# Altium footprint library Wurth_Elektronik_Electromechanic_Wire_to_Board_Connectors_rev16a.PCBLIB: 662 footprints (part 18 of 42)
Each footprint in its own frame and in the unit in brackets; x right, y up, seen from the top. Pads: shape width x height; smd on the part's side, far side on the other; paste and mask are expansions set on the pad; w line width, h text height; cw(c..) or ccw(c..) is an arc to the next point about the centre after c.
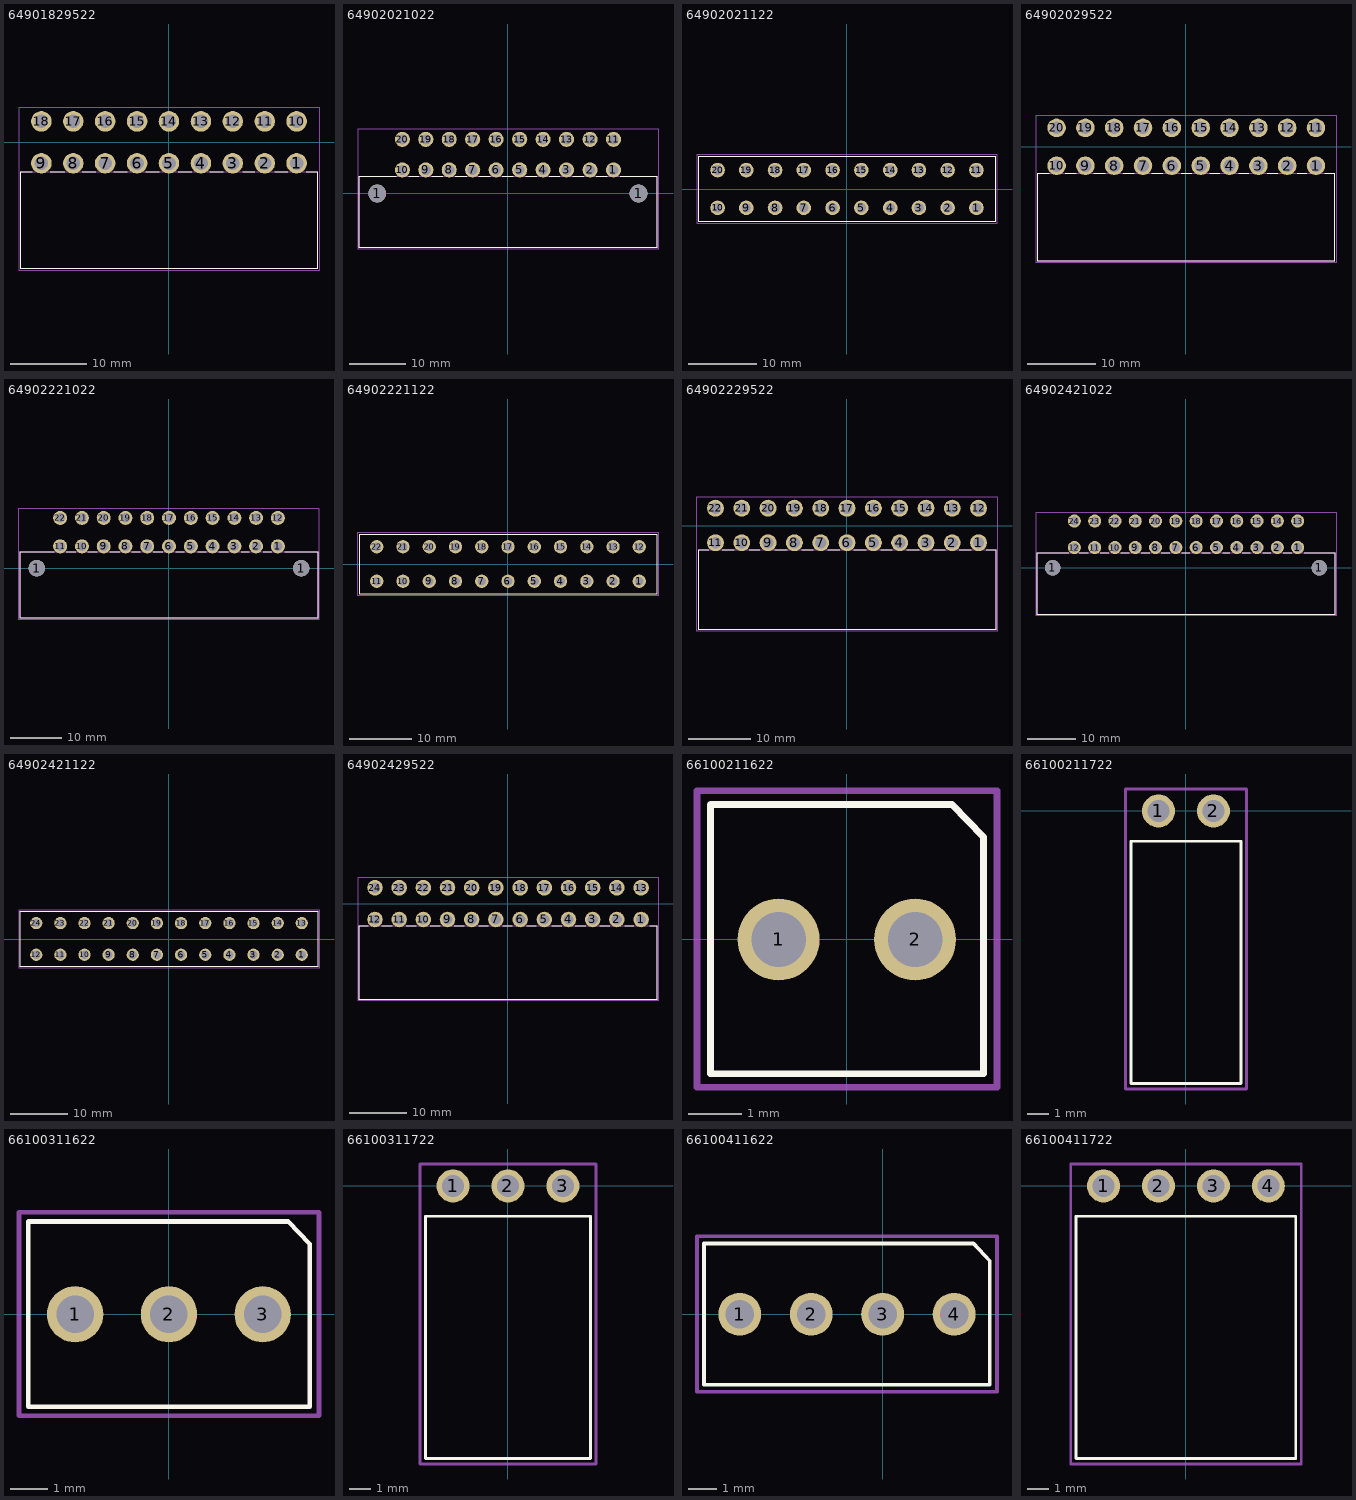
[diagram p17: the footprints below, top view; thin cyan lines are the x and y axes]

## 64901829522 [mil]
pads (18):
  round 106.5 hole 71: 1(662,-108.27) 2(497,-108.27) 3(331,-108.27) 4(166,-108.27) 5(0,-108.27) 6(-165.35,-108.27) 7(-330.71,-108.27) 8(-496.06,-108.27) 9(-661.42,-108.27) 10(662,109) 11(497,109) 12(331,109) 13(166,109) 14(0,109) 15(-165.35,109) 16(-330.71,109) 17(-496.06,109) 18(-661.42,109)
Top Overlay:
  lines w5: -708.66,-151.57 -767.72,-151.57 -767.72,-655.51 768,-655.51 768,-155.51 768,-151.57 711,-151.57 ; -616.14,-151.57 -541.34,-151.57 ; -450.79,-151.57 -379.92,-151.57 ; -287.4,-151.57 -216.54,-151.57 ; -120.08,-151.57 -49.21,-151.57 ; 48,-151.57 117,-151.57 ; 211,-151.57 282,-151.57 ; 382,-151.57 445,-151.57 ; 548,-151.57 617,-151.57
Mechanical 2:
  text ">NAME" at -1090.65,-383.86 h77.5
Mechanical 4:
  text ">VALUE" at -1090.65,-488.29 h77.5
Mechanical 16:
  lines w5: -767.72,-655.51 768,-655.51 768,-151.57 -767.72,-151.57 -767.72,-655.51
  text "18" at -721.85,75 h77.5
  text "1" at 653,-133.86 h77.5
Mechanical 27:
  lines w5: -777.56,-665.35 778,-665.35 778,182 -777.56,182 -777.56,-665.35

## 64902021022 [mil]
pads (22):
  round 126 hole 126: 1(-921.65,0) 1(921,0)
  round 106.5 hole 71: 1(744,166) 2(579,166) 3(413,166) 4(248,166) 5(83,166) 6(-83.07,166) 7(-248.43,166) 8(-413.78,166) 9(-579.13,166) 10(-744.49,166) 11(744,382) 12(579,382) 13(413,382) 14(248,382) 15(83,382) 16(-83.07,382) 17(-248.43,382) 18(-413.78,382) 19(-579.13,382) 20(-744.49,382)
Top Overlay:
  lines w5: -1047.24,123 -1047.24,-381.89 1048,-381.89 1048,123 792,123 ; -1045.28,123 -787.4,123 ; -698.82,123 -627.95,123 ; -535.43,123 -460.63,123 ; -370.08,123 -291.34,123 ; -204.72,123 -125.98,123 ; -39.37,123 38,123 ; 125,123 203,123 ; 292,123 367,123 ; 457,123 534,123 ; 623,123 699,123
Mechanical 2:
  text ">NAME" at -1358.37,-110.24 h77.5
Mechanical 4:
  text ">VALUE" at -1383.37,-189.67 h77.5
Mechanical 16:
  lines w5: -1047.24,-381.89 1048,-381.89 1048,123 -1047.24,123 -1047.24,-381.89
  text "20" at -764.57,349 h77.5
  text "1" at 727,146 h77.5
Mechanical 27:
  lines w5: -1057.09,-391.73 1058,-391.73 1058,455 -1057.09,455 -1057.09,-391.73

## 64902021122 [mil]
pads (20):
  round 84 hole 56: 1(745,-108.27) 2(579,-108.27) 3(414,-108.27) 4(249,-108.27) 5(83,-108.27) 6(-82.68,-108.27) 7(-248.03,-108.27) 8(-413.39,-108.27) 9(-578.74,-108.27) 10(-744.09,-108.27) 11(745,109) 12(579,109) 13(414,109) 14(249,109) 15(83,109) 16(-82.68,109) 17(-248.03,109) 18(-413.39,109) 19(-578.74,109) 20(-744.09,109)
Top Overlay:
  lines w5: -852.36,-188.98 853,-188.98 853,189 -852.36,189 -852.36,-188.98
Mechanical 2:
  text ">NAME" at -108.27,237 h77.5
Mechanical 4:
  text ">VALUE" at -127.95,-285.43 h77.5
Mechanical 16:
  text "1" at 720,-125 h77.5
  text "20" at -780.91,75 h77.5
Mechanical 27:
  lines w5: -862.2,-198.82 863,-198.82 863,199 -862.2,199 -862.2,-198.82

## 64902029522 [mil]
pads (20):
  round 106.5 hole 71: 1(746,-108.27) 2(581,-108.27) 3(416,-108.27) 4(250,-108.27) 5(85,-108.27) 6(-80.91,-108.27) 7(-246.26,-108.27) 8(-411.61,-108.27) 9(-576.97,-108.27) 10(-742.32,-108.27) 11(746,109) 12(581,109) 13(416,109) 14(250,109) 15(85,109) 16(-80.91,109) 17(-246.26,109) 18(-411.61,109) 19(-576.97,109) 20(-742.32,109)
Top Overlay:
  lines w5: -785.43,-151.57 -850.39,-151.57 -850.39,-655.51 851,-655.51 851,-151.57 796,-151.57 ; -692.91,-151.57 -629.92,-151.57 ; -529.53,-151.57 -462.6,-151.57 ; -360.24,-151.57 -297.24,-151.57 ; -194.88,-151.57 -131.89,-151.57 ; -27.56,-151.57 34,-151.57 ; 138,-151.57 195,-151.57 ; 302,-151.57 361,-151.57 ; 467,-151.57 526,-151.57 ; 640,-151.57 693,-151.57
Mechanical 2:
  text ">NAME" at -1231.2,-408.86 h77.5
Mechanical 4:
  text ">VALUE" at -1231.2,-488.29 h77.5
Mechanical 16:
  lines w5: -850.39,-655.51 851,-655.51 851,-151.57 -850.39,-151.57 -850.39,-655.51
  text "20" at -762.4,75 h77.5
  text "1" at 735,-133.86 h77.5
Mechanical 27:
  lines w5: -860.24,-665.35 861,-665.35 861,182 -860.24,182 -860.24,-665.35

## 64902221022 [mil]
pads (24):
  round 126 hole 126: 1(-1003.94,0) 1(1004,0)
  round 106.5 hole 71: 1(827,166) 2(662,166) 3(497,166) 4(331,166) 5(166,166) 6(0,166) 7(-165.35,166) 8(-330.71,166) 9(-496.06,166) 10(-661.42,166) 11(-826.77,166) 12(827,382) 13(662,382) 14(497,382) 15(331,382) 16(166,382) 17(0,382) 18(-165.35,382) 19(-330.71,382) 20(-496.06,382) 21(-661.42,382) 22(-826.77,382)
Top Overlay:
  lines w5: -870.08,123 -1129.92,123 -1129.92,-381.89 1130,-381.89 1130,123 880,123 ; -779.53,123 -708.66,123 ; -618.11,123 -545.28,123 ; -448.82,123 -375.98,123 ; -283.46,123 -216.54,123 ; -118.11,123 -49.21,123 ; 52,123 117,123 ; 217,123 284,123 ; 378,123 449,123 ; 548,123 609,123 ; 715,123 780,123 780,125
Mechanical 2:
  text ">NAME" at -1425.3,-110.24 h77.5
Mechanical 4:
  text ">VALUE" at -1425.3,-189.67 h77.5
Mechanical 16:
  lines w5: -1129.92,-381.89 1130,-381.89 1130,123 -1129.92,123 -1129.92,-381.89
  text "22" at -881.5,374 h77.5
  text "1" at 810,146 h77.5
Mechanical 27:
  lines w5: -1139.76,-391.73 1140,-391.73 1140,455 -1139.76,455 -1139.76,-391.73

## 64902221122 [mil]
pads (22):
  round 84 hole 56: 1(827,-108.27) 2(662,-108.27) 3(497,-108.27) 4(331,-108.27) 5(166,-108.27) 6(0,-108.27) 7(-165.35,-108.27) 8(-330.71,-108.27) 9(-496.06,-108.27) 10(-661.42,-108.27) 11(-826.77,-108.27) 12(827,109) 13(662,109) 14(497,109) 15(331,109) 16(166,109) 17(0,109) 18(-165.35,109) 19(-330.71,109) 20(-496.06,109) 21(-661.42,109) 22(-826.77,109)
Top Overlay:
  lines w5: -935.04,-188.98 936,-188.98 936,189 -935.04,189 -935.04,-188.98
Mechanical 2:
  text ">NAME" at -108.27,237 h77.5
Mechanical 4:
  text ">VALUE" at -127.95,-285.43 h77.5
Mechanical 16:
  text "1" at 802,-125 h77.5
  text "22" at -873.23,75 h77.5
Mechanical 27:
  lines w5: -944.88,-198.82 945,-198.82 945,199 -944.88,199 -944.88,-198.82

## 64902229522 [mil]
pads (22):
  round 106.5 hole 71: 1(827,-108.27) 2(662,-108.27) 3(497,-108.27) 4(331,-108.27) 5(166,-108.27) 6(0,-108.27) 7(-165.35,-108.27) 8(-330.71,-108.27) 9(-496.06,-108.27) 10(-661.42,-108.27) 11(-826.77,-108.27) 12(827,109) 13(662,109) 14(497,109) 15(331,109) 16(166,109) 17(0,109) 18(-165.35,109) 19(-330.71,109) 20(-496.06,109) 21(-661.42,109) 22(-826.77,109)
Top Overlay:
  lines w5: -870.08,-151.57 -933.07,-151.57 -933.07,-655.51 934,-655.51 934,-151.57 875,-151.57 ; -783.46,-151.57 -708.66,-151.57 ; -614.17,-151.57 -547.24,-151.57 ; -452.76,-151.57 -374.02,-151.57 ; -285.43,-151.57 -210.63,-151.57 ; -120.08,-151.57 -45.28,-151.57 ; 44,-151.57 121,-151.57 ; 211,-151.57 284,-151.57 ; 375,-151.57 453,-151.57 ; 544,-151.57 617,-151.57 ; 707,-151.57 780,-151.57
Mechanical 2:
  text ">NAME" at -1250.3,-383.86 h77.5
Mechanical 4:
  text ">VALUE" at -1250.3,-463.29 h77.5
Mechanical 16:
  lines w5: -933.07,-655.51 934,-655.51 934,-151.57 -933.07,-151.57 -933.07,-655.51
  text "22" at -881.5,100 h77.5
  text "1" at 818,-133.86 h77.5
Mechanical 27:
  lines w5: -942.91,-665.35 943,-665.35 943,182 -942.91,182 -942.91,-665.35

## 64902421022 [mil]
pads (26):
  round 126 hole 126: 1(-1086.61,0) 1(1087,0)
  round 106.5 hole 71: 1(910,166) 2(745,166) 3(579,166) 4(414,166) 5(249,166) 6(83,166) 7(-82.68,166) 8(-248.03,166) 9(-413.39,166) 10(-578.74,166) 11(-744.09,166) 12(-909.45,166) 13(910,382) 14(745,382) 15(579,382) 16(414,382) 17(249,382) 18(83,382) 19(-82.68,382) 20(-248.03,382) 21(-413.39,382) 22(-578.74,382) 23(-744.09,382) 24(-909.45,382)
Top Overlay:
  lines w5: -956.69,123 -1212.6,123 -1212.6,-381.89 1213,-381.89 1213,123 ; -868.11,123 -795.28,123 ; -698.82,123 -629.92,123 ; -533.46,123 -460.63,123 ; -366.14,123 -297.24,123 ; -202.76,123 -131.89,123 ; -33.46,123 32,123 ; 130,123 199,123 ; 298,123 357,123 ; 459,123 526,123 ; 625,123 693,123 ; 792,123 863,123 ; 963,123 1211,123
Mechanical 2:
  text ">NAME" at -1517.62,-110.24 h77.5
Mechanical 4:
  text ">VALUE" at -1517.62,-189.67 h77.5
Mechanical 16:
  lines w5: -1212.6,-381.89 1213,-381.89 1213,123 -1212.6,123 -1212.6,-381.89
  text "24" at -923.82,349 h77.5
  text "1" at 893,146 h77.5
Mechanical 27:
  lines w5: -1222.44,-391.73 1223,-391.73 1223,455 -1222.44,455 -1222.44,-391.73

## 64902421122 [mil]
pads (24):
  round 84 hole 56: 1(910,-108.27) 2(745,-108.27) 3(579,-108.27) 4(414,-108.27) 5(249,-108.27) 6(83,-108.27) 7(-82.68,-108.27) 8(-248.03,-108.27) 9(-413.39,-108.27) 10(-578.74,-108.27) 11(-744.09,-108.27) 12(-909.45,-108.27) 13(910,109) 14(745,109) 15(579,109) 16(414,109) 17(249,109) 18(83,109) 19(-82.68,109) 20(-248.03,109) 21(-413.39,109) 22(-578.74,109) 23(-744.09,109) 24(-909.45,109)
Top Overlay:
  lines w5: -1017.72,-188.98 1018,-188.98 1018,189 -1017.72,189 -1017.72,-188.98
Mechanical 2:
  text ">NAME" at -108.27,237 h77.5
Mechanical 4:
  text ">VALUE" at -127.95,-285.43 h77.5
Mechanical 16:
  text "1" at 885,-125 h77.5
  text "24" at -940.55,75 h77.5
Mechanical 27:
  lines w5: -1027.56,-198.82 1028,-198.82 1028,199 -1027.56,199 -1027.56,-198.82

## 64902429522 [mil]
pads (24):
  round 106.5 hole 71: 1(910,-108.27) 2(745,-108.27) 3(579,-108.27) 4(414,-108.27) 5(249,-108.27) 6(83,-108.27) 7(-82.68,-108.27) 8(-248.03,-108.27) 9(-413.39,-108.27) 10(-578.74,-108.27) 11(-744.09,-108.27) 12(-909.45,-108.27) 13(910,109) 14(745,109) 15(579,109) 16(414,109) 17(249,109) 18(83,109) 19(-82.68,109) 20(-248.03,109) 21(-413.39,109) 22(-578.74,109) 23(-744.09,109) 24(-909.45,109)
Top Overlay:
  lines w5: -954.72,-151.57 -1015.75,-151.57 -1015.75,-655.51 1016,-655.51 1016,-151.57 969,-151.57 ; -864.17,-151.57 -791.34,-151.57 ; -696.85,-151.57 -625.98,-151.57 ; -531.5,-151.57 -462.6,-151.57 ; -366.14,-151.57 -299.21,-151.57 ; -198.82,-151.57 -133.86,-151.57 ; -35.43,-151.57 30,-151.57 ; 130,-151.57 193,-151.57 ; 300,-151.57 367,-151.57 ; 461,-151.57 532,-151.57 ; 628,-151.57 695,-151.57 ; 798,-151.57 861,-151.57
Mechanical 2:
  text ">NAME" at -1307.78,-214.57 h77.5
Mechanical 4:
  text ">VALUE" at -1307.78,-294 h77.5
Mechanical 16:
  lines w5: -1015.75,-655.51 1016,-655.51 1016,-151.57 -1015.75,-151.57 -1015.75,-655.51
  text "24" at -923.82,75 h77.5
  text "1" at 901,-133.86 h77.5
Mechanical 27:
  lines w5: -1025.59,-665.35 1026,-665.35 1026,182 -1025.59,182 -1025.59,-665.35

## 66100211622 [mil]
pads (2):
  round 60 hole 40: 1(-50,0) 2(50,0)
Top Overlay:
  lines w5: -100,-98.43 100,-98.43 100,75 77,99 -100,99 -100,-98.43
Mechanical 2:
  text ">Name" at -99.61,130 h77.5
Mechanical 4:
  text ">Value" at -95.67,-169.29 h77.5
Mechanical 27:
  lines w5: -109.84,-108.27 110,-108.27 110,109 -109.84,109 -109.84,-108.27

## 66100211722 [mil]
pads (2):
  round 60 hole 40: 1(-50,0) 2(50,0)
Top Overlay:
  lines w5: -100,-496.06 100,-496.06 100,-55.12 -100,-55.12 -100,-496.06
Mechanical 2:
  text ">Name" at -100,100 h77.5
Mechanical 4:
  text ">Value" at -100,-600 h77.5
Mechanical 27:
  lines w5: -109.84,-505.91 -109.84,40 110,40 110,-505.91 -109.84,-505.91

## 66100311622 [mil]
pads (3):
  round 60 hole 40: 1(-100,0) 2(0,0) 3(100,0)
Top Overlay:
  lines w5: -150,-98.43 150,-98.43 150,75 127,99 -150,99 -150,-98.43
Mechanical 2:
  text ">Name" at -49.61,130 h77.5
Mechanical 4:
  text ">Value" at -45.67,-169.29 h77.5
Mechanical 27:
  lines w5: -159.84,-108.27 160,-108.27 160,109 -159.84,109 -159.84,-108.27

## 66100311722 [mil]
pads (3):
  round 60 hole 40: 1(-100,0) 2(0,0) 3(100,0)
Top Overlay:
  lines w5: -150,-496.06 150,-496.06 150,-55.12 -150,-55.12 -150,-496.06
Mechanical 2:
  text ">Name" at -100,100 h77.5
Mechanical 4:
  text ">Value" at -100,-600 h77.5
Mechanical 27:
  lines w5: -159.84,-505.91 -159.84,40 160,40 160,-505.91 -159.84,-505.91

## 66100411622 [mil]
pads (4):
  round 60 hole 40: 1(-200,0) 2(-100,0) 3(0,0) 4(100,0)
Top Overlay:
  lines w5: -250,-98.43 150,-98.43 150,75 127,99 -250,99 -250,-98.43
Mechanical 2:
  text ">Name" at -149.61,130 h77.5
Mechanical 4:
  text ">Value" at -145.67,-169.29 h77.5
Mechanical 27:
  lines w5: -259.84,-108.27 160,-108.27 160,109 -259.84,109 -259.84,-108.27

## 66100411722 [mil]
pads (4):
  round 60 hole 40: 1(-150,0) 2(-50,0) 3(50,0) 4(150,0)
Top Overlay:
  lines w5: -200,-496.06 200,-496.06 200,-55.12 -200,-55.12 -200,-496.06
Mechanical 2:
  text ">Name" at -100,100 h77.5
Mechanical 4:
  text ">Value" at -100,-600 h77.5
Mechanical 27:
  lines w5: -209.84,-505.91 -209.84,40 210,40 210,-505.91 -209.84,-505.91